# Altium footprint library AOO.PcbLib: 131 footprints (part 7 of 9)
Each footprint in its own frame and in the unit in brackets; x right, y up, seen from the top. Pads: shape width x height; smd on the part's side, far side on the other; paste and mask are expansions set on the pad; w line width, h text height; cw(c..) or ccw(c..) is an arc to the next point about the centre after c.
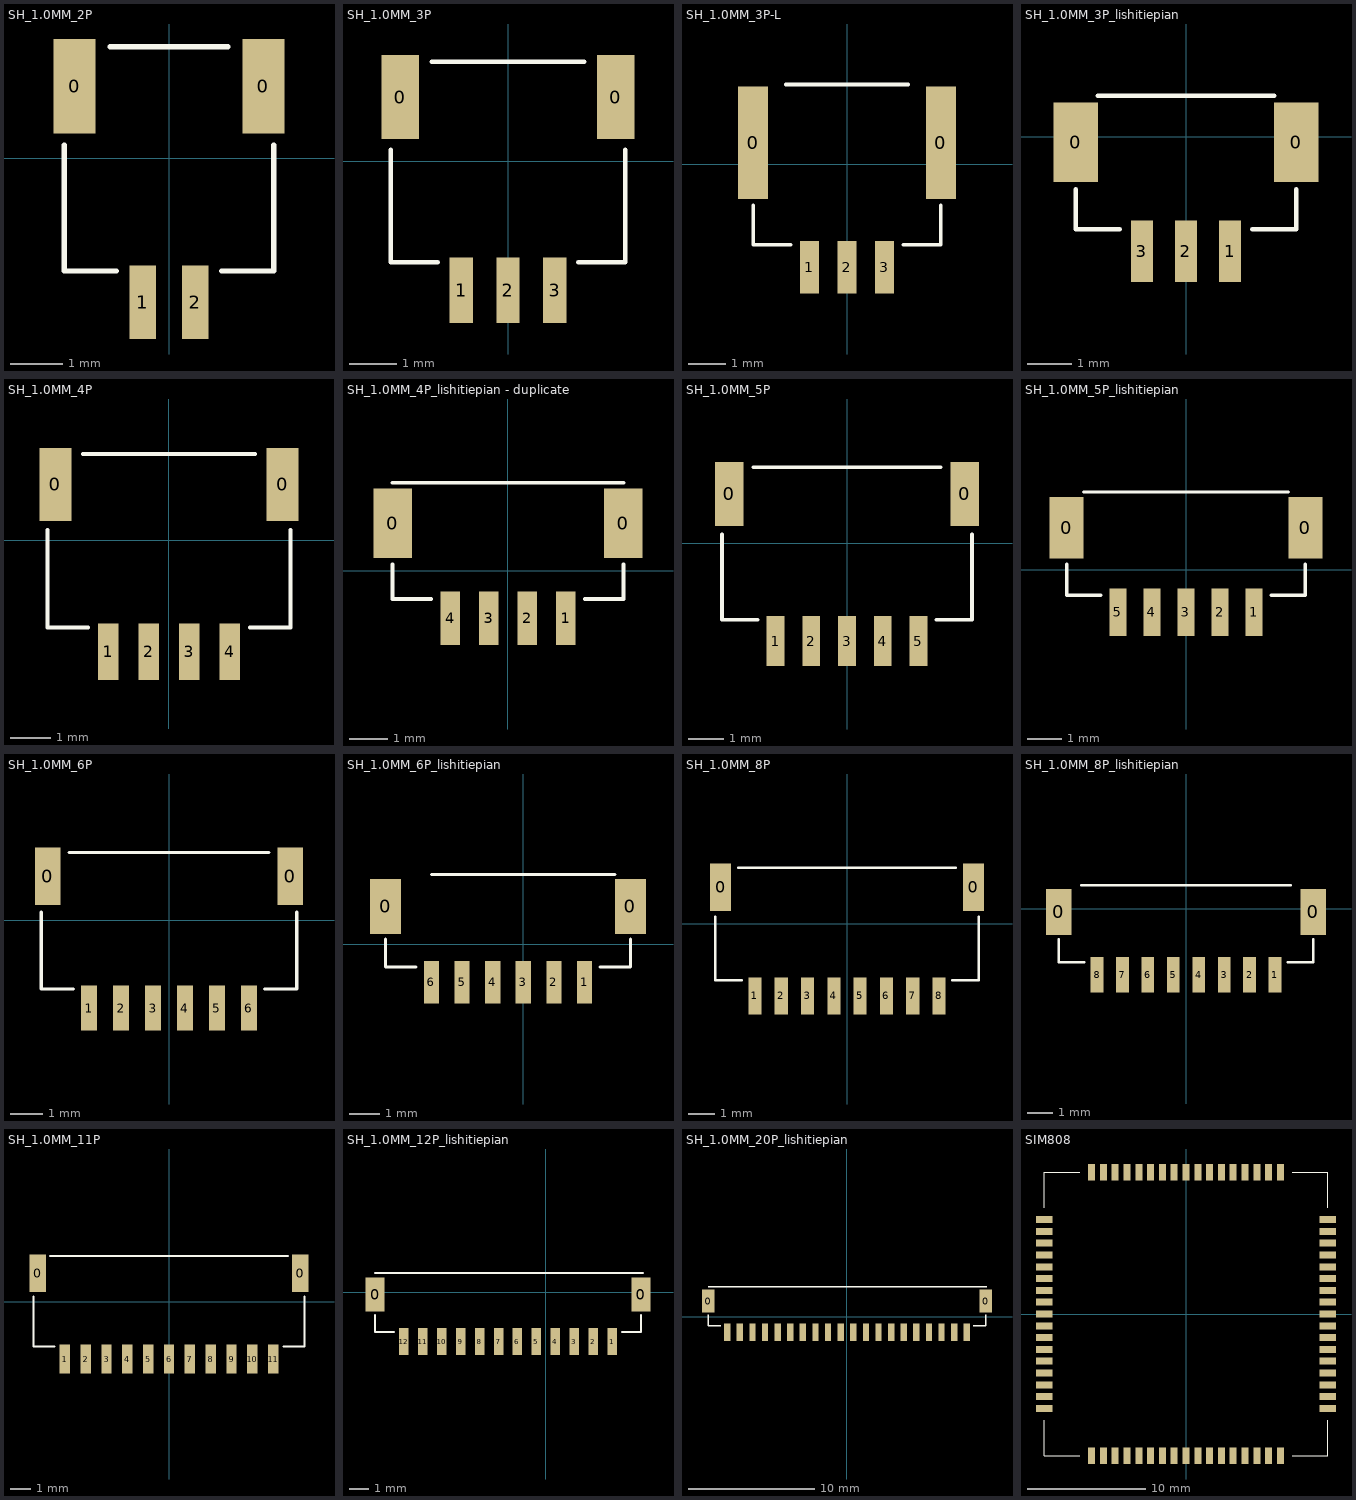
[diagram p6: the footprints below, top view; thin cyan lines are the x and y axes]

## SH_1.0MM_2P [mm]
pads (4):
  rect 0.8x1.8 smd: 0(-1.8,1.375) 0(1.8,1.375)
  rect 0.5x1.4 smd: 1(-0.5,-2.75) 2(0.5,-2.75)
Top Overlay:
  lines w0.1: -2,0.25 -2,-2.15 -1,-2.15 ; -1.125,2.125 1.125,2.125 ; 1,-2.15 2,-2.15 2,0.25
3D body: height 3.02, standoff 0.01, extent -2,-3.095 2,2.125

## SH_1.0MM_3P [mm]
pads (5):
  rect 0.8x1.8 smd: 0(-2.3,1.375) 0(2.3,1.375)
  rect 0.5x1.4 smd: 1(-1,-2.75) 2(0,-2.75) 3(1,-2.75)
Top Overlay:
  lines w0.1: -2.5,0.25 -2.5,-2.15 -1.5,-2.15 ; -1.625,2.125 1.625,2.125 ; 1.5,-2.15 2.5,-2.15 2.5,0.25
3D body: height 3.02, standoff 0.01, extent -2.5,-3.095 2.5,2.125

## SH_1.0MM_3P-L [mm]
pads (5):
  rect 0.8x3 smd: 0(-2.5,0.575) 0(2.5,0.575)
  rect 0.5x1.4 smd: 1(-1,-2.75) 2(0,-2.75) 3(1,-2.75)
Top Overlay:
  lines w0.1: -2.5,-1.1 -2.5,-2.15 -1.5,-2.15 ; -1.625,2.125 1.625,2.125 ; 1.5,-2.15 2.5,-2.15 2.5,-1.1
3D body: height 3.02, standoff 0.01, extent -2.5,-3.095 2.5,2.125

## SH_1.0MM_3P_lishitiepian [mm]
pads (5):
  rect 1x1.8 smd: 0(-2.5,-0.125) 0(2.5,-0.125)
  rect 0.5x1.4 smd: 1(1,-2.6) 2(0,-2.6) 3(-1,-2.6)
Top Overlay:
  lines w0.1: -2.5,-1.195 -2.5,-2.1 -1.5,-2.1 ; -2,0.925 2,0.925 ; 1.5,-2.1 2.5,-2.1 ; 2.5,-2.1 2.5,-1.195
3D body: height 4.52, standoff -0.03, extent -2.5,-2.75 2.5,0.86

## SH_1.0MM_4P [mm]
pads (6):
  rect 0.8x1.8 smd: 0(-2.8,1.375) 0(2.8,1.375)
  rect 0.5x1.4 smd: 1(-1.5,-2.75) 2(-0.5,-2.75) 3(0.5,-2.75) 4(1.5,-2.75)
Top Overlay:
  lines w0.1: -3,0.25 -3,-2.15 -2,-2.15 ; -2.125,2.125 2.125,2.125 ; 2,-2.15 3,-2.15 3,0.25
3D body: height 3.02, standoff 0.01, extent -3,-3.095 3,2.125

## SH_1.0MM_4P_lishitiepian - duplicate [mm]
pads (6):
  rect 1x1.8 smd: 0(-3,1.238) 0(3,1.238)
  rect 0.5x1.4 smd: 1(1.5,-1.237) 2(0.5,-1.237) 3(-0.5,-1.237) 4(-1.5,-1.237)
Top Overlay:
  lines w0.1: -3,0.167 -3,-0.738 -2,-0.738 ; -3,2.287 3,2.287 ; 2,-0.738 3,-0.738 3,0.167
3D body: height 4.52, standoff -0.03, extent -3,-1.35 3,2.26

## SH_1.0MM_5P [mm]
pads (7):
  rect 0.8x1.8 smd: 0(-3.3,1.375) 0(3.3,1.375)
  rect 0.5x1.4 smd: 1(-2,-2.75) 2(-1,-2.75) 3(0,-2.75) 4(1,-2.75) 5(2,-2.75)
Top Overlay:
  lines w0.1: -3.5,0.25 -3.5,-2.15 -2.5,-2.15 ; -2.625,2.125 2.625,2.125 ; 2.5,-2.15 3.5,-2.15 3.5,0.25
3D body: height 3.02, standoff 0.01, extent -3.5,-3.095 3.5,2.125

## SH_1.0MM_5P_lishitiepian [mm]
pads (7):
  rect 1x1.8 smd: 0(-3.5,1.238) 0(3.5,1.238)
  rect 0.5x1.4 smd: 1(2,-1.237) 2(1,-1.237) 3(0,-1.237) 4(-1,-1.237) 5(-2,-1.237)
Top Overlay:
  lines w0.1: -3.5,0.167 -3.5,-0.738 -2.5,-0.738 ; -3,2.287 3,2.287 ; 2.5,-0.738 3.5,-0.738 3.5,0.167
3D body: height 4.52, standoff -0.03, extent -3.5,-1.393 3.5,2.218

## SH_1.0MM_6P [mm]
pads (8):
  rect 0.8x1.8 smd: 0(-3.8,1.375) 0(3.8,1.375)
  rect 0.5x1.4 smd: 1(-2.5,-2.75) 2(-1.5,-2.75) 3(-0.5,-2.75) 4(0.5,-2.75) 5(1.5,-2.75) 6(2.5,-2.75)
Top Overlay:
  lines w0.1: -4,0.25 -4,-2.15 -3,-2.15 ; -3.125,2.125 3.125,2.125 ; 3,-2.15 4,-2.15 4,0.25
3D body: height 3.02, standoff 0.01, extent -4,-3.095 4,2.125

## SH_1.0MM_6P_lishitiepian [mm]
pads (8):
  rect 1x1.8 smd: 0(-4.5,1.238) 0(3.5,1.238)
  rect 0.5x1.4 smd: 1(2,-1.237) 2(1,-1.237) 3(0,-1.237) 4(-1,-1.237) 5(-2,-1.237) 6(-3,-1.237)
Top Overlay:
  lines w0.1: -4.5,0.167 -4.5,-0.738 -3.5,-0.738 ; -3,2.287 3,2.287 ; 2.5,-0.738 3.5,-0.738 3.5,0.167
3D body: height 4.52, standoff -0.03, extent -3.5,-1.393 3.5,2.218

## SH_1.0MM_8P [mm]
pads (10):
  rect 0.8x1.8 smd: 0(-4.8,1.375) 0(4.8,1.375)
  rect 0.5x1.4 smd: 1(-3.5,-2.75) 2(-2.5,-2.75) 3(-1.5,-2.75) 4(-0.5,-2.75) 5(0.5,-2.75) 6(1.5,-2.75) 7(2.5,-2.75) 8(3.5,-2.75)
Top Overlay:
  lines w0.1: -5,0.25 -5,-2.15 -4,-2.15 ; -4.125,2.125 4.125,2.125 ; 4,-2.15 5,-2.15 5,0.25
3D body: height 3.02, standoff 0.01, extent -5,-3.095 5,2.125

## SH_1.0MM_8P_lishitiepian [mm]
pads (10):
  rect 1x1.8 smd: 0(-5,-0.125) 0(5,-0.125)
  rect 0.5x1.4 smd: 1(3.5,-2.6) 2(2.5,-2.6) 3(1.5,-2.6) 4(0.5,-2.6) 5(-0.5,-2.6) 6(-1.5,-2.6) 7(-2.5,-2.6) 8(-3.5,-2.6)
Top Overlay:
  lines w0.1: -5,-1.195 -5,-2.1 -4,-2.1 ; -4.125,0.925 4.125,0.925 ; 4,-2.1 5,-2.1 5,-1.195
3D body: height 4.57, standoff 0.02, extent -5,-2.75 5,0.86

## SH_1.0MM_11P [mm]
pads (13):
  rect 0.8x1.8 smd: 0(-6.3,1.375) 0(6.3,1.375)
  rect 0.5x1.4 smd: 1(-5,-2.75) 2(-4,-2.75) 3(-3,-2.75) 4(-2,-2.75) 5(-1,-2.75) 6(0,-2.75) 7(1,-2.75) 8(2,-2.75) 9(3,-2.75) 10(4,-2.75) 11(5,-2.75)
Top Overlay:
  lines w0.1: -6.5,0.25 -6.5,-2.15 -5.5,-2.15 ; -5.7,2.2 5.7,2.2 ; 5.5,-2.15 6.5,-2.15 6.5,0.25
3D body: height 3.02, standoff 0.01, extent -6.5,-3.095 6.5,2.125

## SH_1.0MM_12P_lishitiepian [mm]
pads (14):
  rect 1x1.8 smd: 0(-9,-0.125) 0(5,-0.125)
  rect 0.5x1.4 smd: 1(3.5,-2.6) 2(2.5,-2.6) 3(1.5,-2.6) 4(0.5,-2.6) 5(-0.5,-2.6) 6(-1.5,-2.6) 7(-2.5,-2.6) 8(-3.5,-2.6) 9(-4.5,-2.6) 10(-5.5,-2.6) 11(-6.5,-2.6) 12(-7.5,-2.6)
Top Overlay:
  lines w0.1: -9,-1.195 -9,-2.1 -8,-2.1 ; -9,1 5.1,1 ; 4,-2.1 5,-2.1 5,-1.195
3D body: height 4.57, standoff 0.02, extent -5,-2.75 5,0.86

## SH_1.0MM_20P_lishitiepian [mm]
pads (22):
  rect 1x1.8 smd: 0(-11,1.238) 0(11,1.238)
  rect 0.5x1.4 smd: 1(9.5,-1.237) 2(8.5,-1.237) 3(7.5,-1.237) 4(6.5,-1.237) 5(5.5,-1.237) 6(4.5,-1.237) 7(3.5,-1.237) 8(2.5,-1.237) 9(1.5,-1.237) 10(0.5,-1.237) 11(-0.5,-1.237) 12(-1.5,-1.237) 13(-2.5,-1.237) 14(-3.5,-1.237) 15(-4.5,-1.237) 16(-5.5,-1.237) 17(-6.5,-1.237) 18(-7.5,-1.237) 19(-8.5,-1.237) 20(-9.5,-1.237)
Top Overlay:
  lines w0.1: -11,-0.738 -11,0.167 ; -11,-0.738 -10,-0.738 ; -11,2.362 11.1,2.362 ; 10,-0.738 11,-0.738 11,0.167
3D body: height 4.57, standoff 0.02, extent -11,-1.25 11,2.36

## SIM808 [mm]
pads (68):
  rect 1.4x0.6 smd: 1(-12.01,8) 2(-12.01,7) 3(-12.01,6) 4(-12.01,5) 5(-12.01,4) 6(-12.01,3) 7(-12.01,2) 8(-12.01,1) 9(-12.01,0) 10(-12.01,-1) 11(-12.01,-2) 12(-12.01,-3) 13(-12.01,-4) 14(-12.01,-5) 15(-12.01,-6) 16(-12.01,-7) 17(-12.01,-8) 35(12.01,-8) 36(12.01,-7) 37(12.01,-6) 38(12.01,-5) 39(12.01,-4) 40(12.01,-3) 41(12.01,-2) 42(12.01,-1) 43(12.01,0) 44(12.01,1) 45(12.01,2) 46(12.01,3) 47(12.01,4) 48(12.01,5) 49(12.01,6) 50(12.01,7) 51(12.01,8)
  rect 0.6x1.4 smd: 18(-8,-12.01) 19(-7,-12.01) 20(-6,-12.01) 21(-5,-12.01) 22(-4,-12.01) 23(-3,-12.01) 24(-2,-12.01) 25(-1,-12.01) 26(0,-12.01) 27(1,-12.01) 28(2,-12.01) 29(3,-12.01) 30(4,-12.01) 31(5,-12.01) 32(6,-12.01) 33(7,-12.01) 34(8,-12.01) 52(8,12.01) 53(7,12.01) 54(6,12.01) 55(5,12.01) 56(4,12.01) 57(3,12.01) 58(2,12.01) 59(1,12.01) 60(0,12.01) 61(-1,12.01) 62(-2,12.01) 63(-3,12.01) 64(-4,12.01) 65(-5,12.01) 66(-6,12.01) 67(-7,12.01) 68(-8,12.01)
Top Overlay:
  lines w0.1: -12.01,-9 -12.01,-12.01 -9,-12.01 ; -12.01,9 -12.01,12.01 -9,12.01 ; 9,-12.01 12.01,-12.01 12.01,-9 ; 9,12.01 12.01,12.01 12.01,9
3D body: height 2.62, standoff 0, extent -12.01,-12.01 12.01,12.01